# Altium footprint library PCBLIB.PcbLib: 557 footprints (part 14 of 36)
Each footprint in its own frame and in the unit in brackets; x right, y up, seen from the top. Pads: shape width x height; smd on the part's side, far side on the other; paste and mask are expansions set on the pad; w line width, h text height; cw(c..) or ccw(c..) is an arc to the next point about the centre after c.
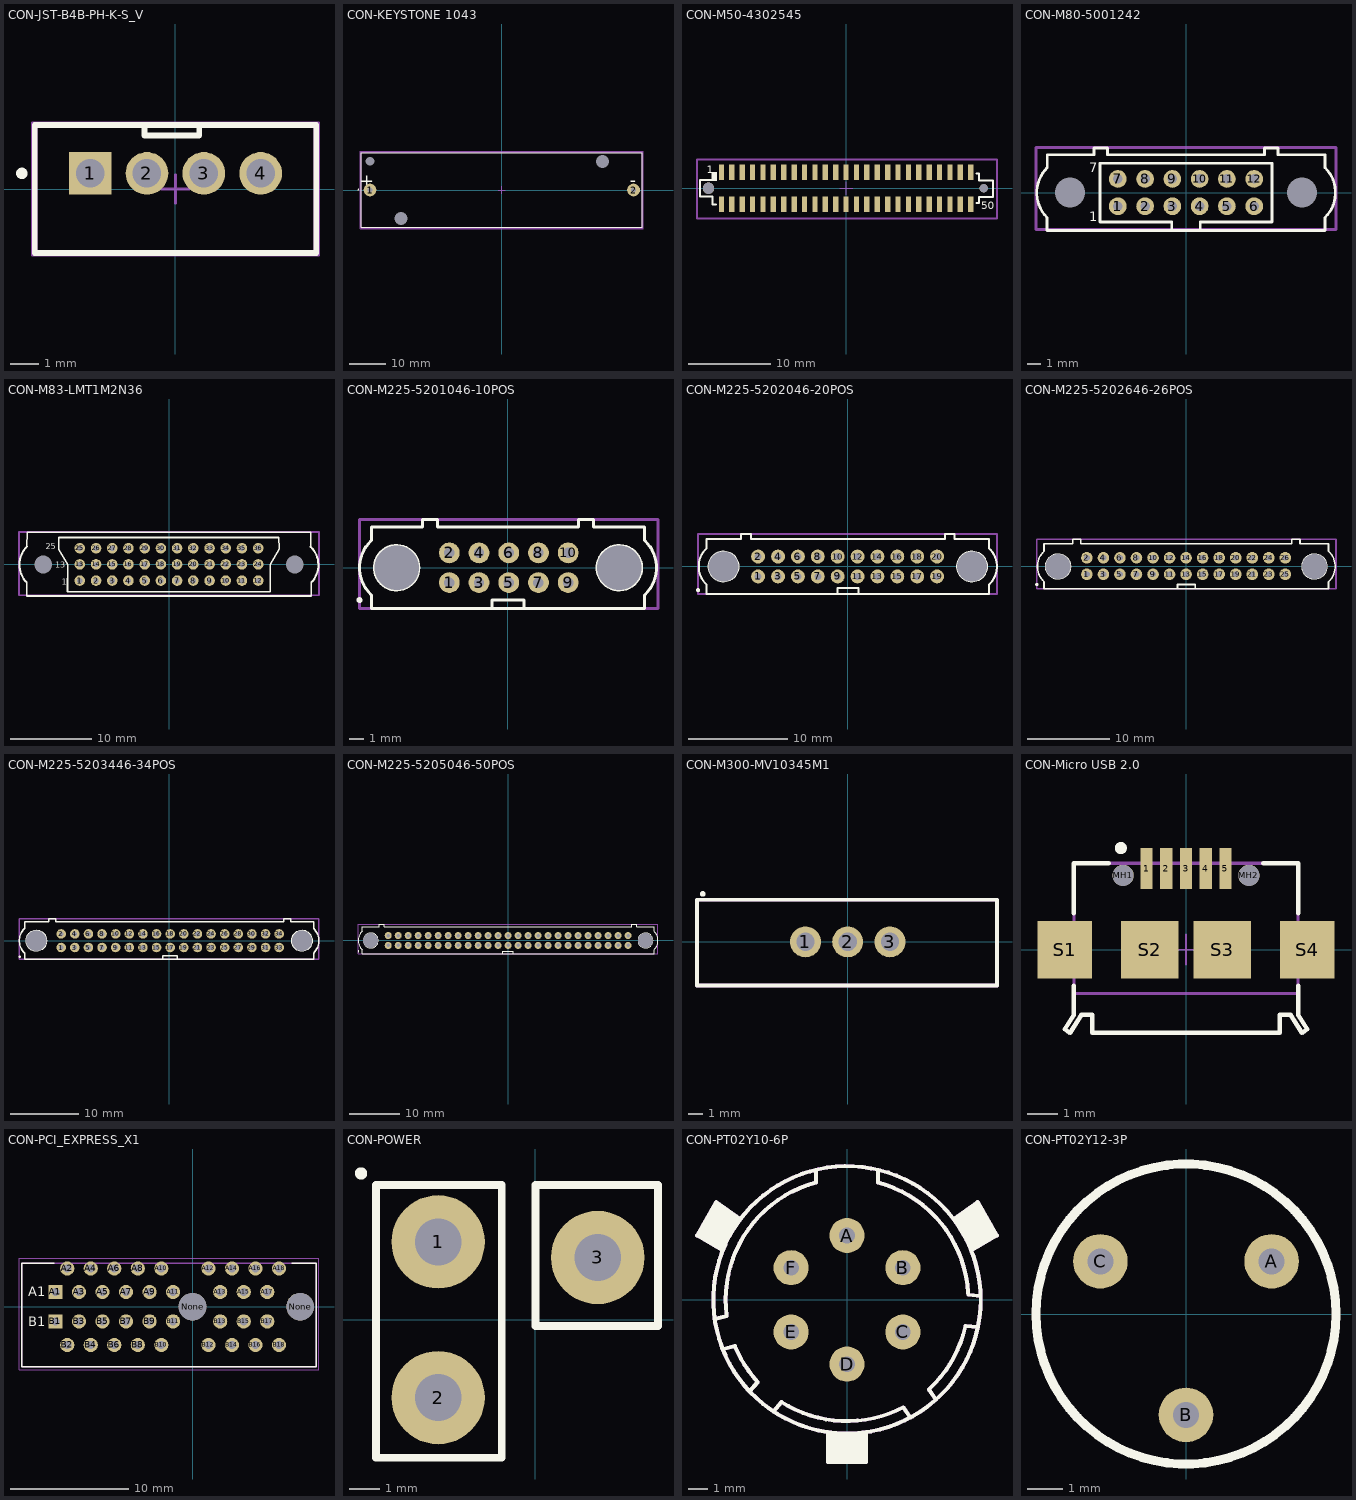
[diagram p13: the footprints below, top view; thin cyan lines are the x and y axes]

## CON-JST-B4B-PH-K-S_V [mm] "Connector, 4-Leads, Body 9.9x4.5mm, Pitch 2mm"
height 6
pads (4):
  rect 1.5x1.5 hole 1: 1(-3,0.55)
  round 1.5 hole 1: 2(-1,0.55) 3(1,0.55) 4(3,0.55)
Top Overlay:
  circle w0.2: c-5.4,0.55 r0.1
  lines w0.15: -1.088,1.882 -1.086,1.88 ; 0.83,1.88 0.837,1.887
  lines w0.2: -1.088,1.882 -1.088,2.25 ; -1.086,1.88 0.83,1.88 ; 0.837,1.887 0.837,2.25 ; -4.95,-2.25 -4.95,2.25 4.95,2.25 4.95,-2.25 -4.95,-2.25
Mechanical 15:
  lines w0.05: -5.05,-2.35 5.05,-2.35 5.05,2.35 -5.05,2.35 -5.05,-2.35
  lines w0.1: -0.5,0 0.5,0 ; 0,-0.5 0,0.5
ASM Top:
  lines w0.2: -4.95,-2.25 -4.95,2.25 4.95,2.25 4.95,-2.25 -4.95,-2.25
  text ".designator" at -0.676,-0.126 h0.8
3D body "B4B-PH-K-S.STEP": height 6.01, standoff -3.39, extent -4.95,-2.25 4.95,2.25

## CON-KEYSTONE 1043 [mm]
height 16
pads (5):
  round 3.5 hole 1.32 unplated: 1(-36.11,0) 2(36.11,0)
  rect 0x0 hole 2.39 unplated: M(-36.11,7.87)
  rect 0x0 hole 3.55 unplated: M(-27.6,-7.87) M(27.6,7.87)
Top Overlay:
  circle w0.2: c-39.3,0.1 r0.1
  lines w0.2: -38.5,-10.25 38.5,-10.25 38.5,10.25 -38.5,10.25 -38.5,-10.25
  text "-" at 36.8,4.85 h6
  text "+" at -35,5.15 h6
Mechanical 13:
  lines w0.1: -38.525,-10.325 38.525,-10.325 38.525,10.325 -38.525,10.325 -38.525,-10.325
Mechanical 15:
  lines w0.05: -38.8,-10.6 38.8,-10.6 38.8,10.6 -38.8,10.6 -38.8,-10.6
  lines w0.2: -1,0 1,0 ; 0,-1 0,1
ASM Top:
  lines w0.2: -38.5,-10.3 -38.5,10.3 38.5,10.3 38.5,-10.3 -38.5,-10.3
  text ".designator" at -1,0.2 h0.8
3D body "Keystone - PN1043.step": height 14.86, standoff -3.56, extent -38.527,-10.325 38.527,10.325

## CON-M50-4302545 [mm]
pads (52):
  rect 0.65x1.9 smd mask+0.05: 1(-15.24,1.95) 2(-13.97,1.95) 3(-12.7,1.95) 4(-11.43,1.95) 5(-10.16,1.95) 6(-8.89,1.95) 7(-7.62,1.95) 8(-6.35,1.95) 9(-5.08,1.95) 10(-3.81,1.95) 11(-2.54,1.95) 12(-1.27,1.95) 13(0,1.95) 14(1.27,1.95) 15(2.54,1.95) 16(3.81,1.95) 17(5.08,1.95) 18(6.35,1.95) 19(7.62,1.95) 20(8.89,1.95) 21(10.16,1.95) 22(11.43,1.95) 23(12.7,1.95) 24(13.97,1.95) 25(15.24,1.95) 26(-15.24,-1.95) 27(-13.97,-1.95) 28(-12.7,-1.95) 29(-11.43,-1.95) 30(-10.16,-1.95) 31(-8.89,-1.95) 32(-7.62,-1.95) 33(-6.35,-1.95) 34(-5.08,-1.95) 35(-3.81,-1.95) 36(-2.54,-1.95) 37(-1.27,-1.95) 38(0,-1.95) 39(1.27,-1.95) 40(2.54,-1.95) 41(3.81,-1.95) 42(5.08,-1.95) 43(6.35,-1.95) 44(7.62,-1.95) 45(8.89,-1.95) 46(10.16,-1.95) 47(11.43,-1.95) 48(12.7,-1.95) 49(13.97,-1.95) 50(15.24,-1.95)
  round 1.4 hole 1.4: MP1(-16.82,0)
  round 1 hole 1: MP2(16.82,0)
Top Overlay:
  rectangle: -16.325,0.875 -15.775,1.975
  lines w0.254: -15.9,-2 -16.325,-2 -16.325,-1.025 -17.875,-1.025 -17.85,1 -16.325,1 -16.325,1.85 -15.9,1.85 ; 15.925,-1.775 16.225,-1.775 16.225,-1.05 17.975,-1.05 17.975,0.975 16.225,0.975 16.225,1.825 15.925,1.825
  text "50" at 16.525,-2.875 h1.6
  text "1" at -17.05,1.55 h1.6
Mechanical 15:
  lines w0.15: -0.8,0 0,0 ; 0,-0.8 0,0 ; 0,0.8 0,0 ; 0.8,0 0,0
  lines w0.254: -18.225,-3.7 -18.225,3.525 18.45,3.525 18.45,-3.7 -18.225,-3.7
3D body "M50-4302545.stp": height 4.6, standoff -0.9, extent -17.725,-2.375 17.775,2.42

## CON-M80-5001242 [mm] "6+6 Pos. Male DIL Vertical Throughboard Conn. Jackscrews"
pads (16):
  round 1.3 hole 0.7: 1(-5,-1) 1(-5,-1) 2(-3,-1) 3(-1,-1) 4(1,-1) 5(3,-1) 6(5,-1) 7(-5,1) 7(-5,1) 8(-3,1) 9(-1,1) 10(1,1) 11(3,1) 12(5,1)
  round 0 hole 2.2 unplated: MP1(-8.5,0) MP2(8.5,0)
Top Overlay:
  lines w0.2: -10.2,-2.775 10.2,-2.775 10.2,-1.825 ccw(c8.375,0) 10.2,1.825 10.2,2.775 6.75,2.775 6.75,3.275 5.75,3.275 5.75,2.775 -5.75,2.775 -5.75,3.275 -6.75,3.275 -6.75,2.775 -10.175,2.775 -10.175,1.825 ccw(c-8.363,-0.012) -10.2,-1.825 -10.2,-2.775 ; -6.3,-2.15 -6.3,2.15 6.3,2.15 6.3,-2.15 1.05,-2.15 1.05,-2.775 1.025,-2.775 -1.05,-2.775 -1.05,-2.15 -6.3,-2.15
  text "7" at -7.1,1.5 h0.7
  text "1" at -7.1,-2.1 h0.7
ASM Top:
  lines w0.2: -11,-2.7 11,-2.7 11,3.3 -11,3.3 -11,-2.7
  text ".designator" at -0.5,0 h0.8
3D body "m80-5001205_asm.stp": height 5.61, standoff -3.24, extent -11,-2.775 11,3.275

## CON-M83-LMT1M2N36 [mm] "Connector Header Through Hole 36 position 0.079\" (2.00mm)"
pads (56):
  round 1.3 hole 0.65: 1(-11,-2) 1(-11,-2) 2(-9,-2) 3(-7,-2) 4(-5,-2) 5(-3,-2) 6(-1,-2) 7(1,-2) 8(3,-2) 9(5,-2) 10(7,-2) 11(9,-2) 12(11,-2) 13(-11,0) 13(-11,0) 14(-9,0) 15(-7,0) 16(-5,0) 17(-3,0) 18(-1,0.025) 19(1,0) 20(3,0) 21(5,0) 22(7,0) 23(9,0) 24(11,0) 25(-11,2) 25(-11,2) 26(-9,2) 27(-7,2) 28(-5,2) 29(-3,2) 30(-1,2) 31(1,2) 32(3,2) 33(5,2) 34(7,2) 35(9,2) 36(11,2)
  round 0 hole 2.2: 2(-15.5,0) 2(15.5,0)
  round 0 on Top Overlay: entry(-12.9,2.4) entry(-12.8,2.2) entry(-12.8,2.2) entry(-12.8,2.2) entry(-12.8,2.6) entry(-12.8,2.6) entry(-12.5,2.3)
  oval 0.1x0 on Top Overlay: entry(-12.8,2.2)
  round 0 on Drill Guide: entry(-12.8,2.6) entry(-12.8,2.6) entry(-12.8,2.6) entry(-12.5,2.1) entry(-12.4,2.3) entry(-12.4,2.3) entry(-12.1,1.8)
Top Overlay:
  lines w0.2: -17.55,-2.225 -17.55,-3.9 17.55,-3.9 ; -17.525,2.2 -17.5,3.95 17.5,3.95 17.475,2.175 ; 17.55,-3.875 17.55,-2.225 ; -13.575,1.85 -13.575,3.325 13.55,3.325 13.575,1.9 12.5,0 12.5,-3.35 -12.525,-3.35 -12.5,0 -13.575,1.85
  lines w0.254: -17.55,-2.225 cw(c-15.325,-0.025) -17.525,2.2 ; 17.475,2.175 cw(c15.312,-0.062) 17.55,-2.225
  text "25" at -15.2,1.9 h0.7
  text "13" at -14,-0.4 h0.7
  text "1" at -13.2,-2.5 h0.7
ASM Top:
  lines w0.2: -18.5,-3.8 -18.5,4 18.5,4 18.5,-3.8 -18.5,-3.8
  text ".designator" at 0.2,-0.1 h0.8
3D body "m83-lmt1m2n36-0000-000_asm.stp": height 6.11, standoff -4.49, extent -18.5,-3.85 18.5,3.85

## CON-M225-5201046-10POS [mm]
pads (12):
  round 1.4 hole 0.7: 1(-3.95,-1) 2(-3.95,1) 3(-1.95,-1) 4(-1.95,1) 5(0.05,-1) 6(0.05,1) 7(2.05,-1) 8(2.05,1) 9(4.05,-1) 10(4.05,1)
  round 0 hole 3 unplated: MH1(-7.5,0) MH2(7.5,0)
Top Overlay:
  circle w0.2: c-10,-2.175 r0.1
  circle w0.2: c7.5,0 r1.5
  circle w0.2: c-7.5,0 r1.5
  lines w0.2: -1.063,-2.75 -1.063,-2.175 1.062,-2.175 1.062,-2.75 ; -9.2,-2.75 9.2,-2.75 9.2,-1.833 ccw(c7.5,0) 9.2,1.833 9.2,2.75 5.75,2.75 5.75,3.25 4.75,3.25 4.75,2.75 -4.75,2.75 -4.75,3.25 -5.75,3.25 -5.75,2.75 -9.2,2.75 -9.2,1.833 ccw(c-7.5,0) -9.2,-1.833 -9.2,-2.75
ASM Top:
  lines w0.2: -10,-2.75 10.1,-2.75 10.1,3.25 -10,3.25 -10,-2.75
  text ".designator" at -2.21,-0.229 h0.8
3D body "m225-5201046_10pos.stp": height 5.45, standoff -3.4, extent -10,-2.75 10,3.25

## CON-M225-5202046-20POS [mm]
pads (22):
  round 1.4 hole 0.7: 1(-9.025,-1) 2(-9.025,1) 3(-7.025,-1) 4(-7.025,1) 5(-5.025,-1) 6(-5.025,1) 7(-3.025,-1) 8(-3.025,1) 9(-1.025,-1) 10(-1.025,1) 11(0.975,-1) 12(0.975,1) 13(2.975,-1) 14(2.975,1) 15(4.975,-1) 16(4.975,1) 17(6.975,-1) 18(6.975,1) 19(8.975,-1) 20(8.975,1)
  round 0 hole 3 unplated: MH1(-12.5,0) MH2(12.5,0)
Top Overlay:
  circle w0.2: c-12.5,0 r1.5
  circle w0.2: c12.497,0 r1.5
  circle w0.2: c-15.074,-2.381 r0.1
  lines w0.2: -9.838,3.25 -10.75,3.25 -10.75,2.75 -14.2,2.75 -14.2,1.833 ccw(c-12.5,0) -14.2,-1.833 -14.2,-2.75 14.197,-2.75 14.197,-1.833 ccw(c12.497,0) 14.197,1.833 14.197,2.75 10.75,2.75 10.75,3.25 9.75,3.25 9.75,2.75 -9.75,2.75 -9.75,3.25 ; -1.063,-2.75 -1.063,-2.175 1.062,-2.175 1.062,-2.75
ASM Top:
  lines w0.2: -15.074,-2.75 -15.074,-2.66 -15.074,3.25 15,3.25 15,-2.75 -15.074,-2.75
  text ".designator" at -2.159,-0.229 h0.8
3D body "m225-5202046_20POS.stp": height 5.45, standoff -3.4, extent -15,-2.75 15,3.25

## CON-M225-5202646-26POS [mm]
pads (28):
  round 1.4 hole 0.7: 1(-12.025,-0.95) 2(-12.025,1.05) 3(-10.025,-0.95) 4(-10.025,1.05) 5(-8.025,-0.95) 6(-8.025,1.05) 7(-6.025,-0.95) 8(-6.025,1.05) 9(-4.025,-0.95) 10(-4.025,1.05) 11(-2.025,-0.95) 12(-2.025,1.05) 13(-0.025,-0.95) 14(-0.025,1.05) 15(1.975,-0.95) 16(1.975,1.05) 17(3.975,-0.95) 18(3.975,1.05) 19(5.975,-0.95) 20(5.975,1.05) 21(7.975,-0.95) 22(7.975,1.05) 23(9.975,-0.95) 24(9.975,1.05) 25(11.975,-0.95) 26(11.975,1.05)
  round 0 hole 3: MH1(-15.5,0) MH2(15.5,0)
Top Overlay:
  circle w0.2: c-18.075,-2.175 r0.1
  circle w0.2: c-15.5,0 r1.5
  circle w0.2: c15.5,0 r1.5
  lines w0.2: -1.063,-2.7 -1.063,-2.175 1.062,-2.175 1.062,-2.7 ; -17.2,-2.7 17.2,-2.7 17.2,-1.833 ccw(c15.5,0) 17.2,1.833 17.2,2.75 13.75,2.75 13.75,3.3 12.75,3.3 12.75,2.75 -12.75,2.75 -12.75,3.3 -13.75,3.3 -13.75,2.75 -17.2,2.75 -17.2,1.833 ccw(c-15.5,0) -17.2,-1.833 -17.2,-2.7
ASM Top:
  lines w0.2: -18.075,-2.7 18.1,-2.7 18.1,3.3 -18.075,3.3 -18.075,-2.7
  text ".designator" at -1.448,-0.25 h0.8
3D body "m225-5202646_26POS.stp": height 5.45, standoff -3.4, extent -18,-2.75 18,3.25

## CON-M225-5203446-34POS [mm]
pads (36):
  round 1.4 hole 0.7: 1(-15.85,-1) 2(-15.85,1) 3(-13.85,-1) 4(-13.85,1) 5(-11.85,-1) 6(-11.85,1) 7(-9.85,-1) 8(-9.85,1) 9(-7.85,-1) 10(-7.85,1) 11(-5.85,-1) 12(-5.85,1) 13(-3.85,-1) 14(-3.85,1) 15(-1.85,-1) 16(-1.85,1) 17(0.15,-1) 18(0.15,1) 19(2.15,-1) 20(2.15,1) 21(4.15,-1) 22(4.15,1) 23(6.15,-1) 24(6.15,1) 25(8.15,-1) 26(8.15,1) 27(10.15,-1) 28(10.15,1) 29(12.15,-1) 30(12.15,1) 31(14.15,-1) 32(14.15,1) 33(16.15,-1) 34(16.15,1)
  round 0 hole 3 unplated: MH1(-19.5,0) MH2(19.5,0)
Top Overlay:
  circle w0.2: c-21.946,-2.362 r0.1
  circle w0.2: c19.5,0 r1.5
  circle w0.2: c-19.5,0 r1.5
  lines w0.2: -0.963,-2.75 -0.963,-2.175 1.162,-2.175 1.162,-2.75 ; -17.65,3.25 -16.65,3.25 -16.65,2.75 16.85,2.75 16.85,3.25 17.85,3.25 17.85,2.75 21.2,2.75 21.2,1.833 cw(c19.5,0) 21.2,-1.833 21.2,-2.75 -21.2,-2.75 -21.2,-1.833 cw(c-19.5,0) -21.2,1.833 -21.2,2.75 -17.65,2.75 -17.65,3.25 ; -17.65,3.25 -17.65,3.25
ASM Top:
  lines w0.2: -21.996,-2.75 -21.996,3.25 21.982,3.25 21.982,-2.75 -21.996,-2.75
  text ".designator" at -0.61,-0.203 h0.8
3D body "M225-5203446-34POS.stp": height 5.55, standoff -3.3, extent -21.9,-2.75 22.1,3.25

## CON-M225-5205046-50POS [mm]
pads (52):
  round 1.4 hole 0.7: 1(-24,-1) 2(-24,1) 3(-22,-1) 4(-22,1) 5(-20,-1) 6(-20,1) 7(-18,-1) 8(-18,1) 9(-16,-1) 10(-16,1) 11(-14,-1) 12(-14,1) 13(-12,-1) 14(-12,1) 15(-10,-1) 16(-10,1) 17(-8,-1) 18(-8,1) 19(-6,-1) 20(-6,1) 21(-4,-1) 22(-4,1) 23(-2,-1) 24(-2,1) 25(0,-1) 26(0,1) 27(2,-1) 28(2,1) 29(4,-1) 30(4,1) 31(6,-1) 32(6,1) 33(8,-1) 34(8,1) 35(10,-1) 36(10,1) 37(12,-1) 38(12,1) 39(14,-1) 40(14,1) 41(16,-1) 42(16,1) 43(18,-1) 44(18,1) 45(20,-1) 46(20,1) 47(22,-1) 48(22,1) 49(24,-1) 50(24,1)
  round 0 hole 3 unplated: MH1(27.5,0) MH2(-27.5,0)
Top Overlay:
  circle w0.2: c-29.947,-2.184 r0.1
  circle w0.2: c-27.5,0 r1.5
  circle w0.2: c27.5,0 r1.5
  lines w0.2: -1.063,-2.7 -1.063,-2.125 1.062,-2.125 1.062,-2.7 ; 29.194,2.8 25.75,2.8 25.75,3.3 24.75,3.3 24.75,2.8 -24.75,2.8 -24.75,3.3 -25.75,3.3 -25.75,2.8 -29.2,2.8 -29.2,1.833 ccw(c-27.5,0) -29.2,-1.833 -29.2,-2.7 29.2,-2.7 29.2,-1.833 ccw(c27.5,0) 29.2,1.833 29.2,2.8
ASM Top:
  lines w0.2: -30,-2.7 -30,3.3 30,3.3 30,-2.7 -30,-2.7
  text ".designator" at -0.61,-0.127 h0.8
3D body "M225-5205046.stp": height 5.45, standoff -3.4, extent -30,-2.7 30,3.3

## CON-M300-MV10345M1 [mm]
pads (3):
  round 2.2 hole 1.3: 1(-3,0) 2(0,0) 3(3,0)
Top Overlay:
  circle w0.2: c-10.287,3.404 r0.1
  lines w0.254: -10.7,-3.1 10.6,-3.1 10.6,3 -10.7,3 -10.7,-3.1
ASM Top:
  lines w0.254: -10.7,-3.1 -10.7,3 10.6,3 10.6,-3.1 -10.7,-3.1
  text ".designator" at -7.1,-0.5 h0.8
3D body "m300-mv10345m1_asm.stp": height 7, standoff -3.2, extent -10.7,-3 10.6,3

## CON-Micro USB 2.0 [mm] "Micro USB 2.0 SMT Type B Horizontal 5 Contacts"
height 3
pads (11):
  rect 0.4x1.35 smd: 1(-1.3,2.675) 2(-0.65,2.675) 3(0,2.675) 4(0.65,2.675) 5(1.3,2.675)
  round 0.7 hole 0.7 unplated: MH1(-2.075,2.45) MH2(2.075,2.45)
  rect 1.8x1.9 smd: S1(-4,0) S4(4,0)
  rect 1.9x1.9 smd: S2(-1.2,0) S3(1.2,0)
Top Overlay:
  circle w0.2: c-2.15,3.35 r0.1
  lines w0.15: -3.7,-1.2 -3.7,-2.15 -4,-2.625 -3.825,-2.75 -3.45,-2.15 -3.1,-2.15 -3.1,-2.75 3.1,-2.75 3.1,-2.15 3.45,-2.15 3.825,-2.75 4,-2.625 3.7,-2.15 3.7,-1.2 ; -3.7,1.2 -3.7,2.85 -2.55,2.85 ; 2.55,2.85 3.7,2.85 3.7,1.2
Dimensions:
  lines w0.1: -3.7,-1.45 3.7,-1.45
  text "PCB Edge" at -1.2,-2.1 h0.41
Mechanical 15:
  lines w0.05: -0.5,0 0.5,0 ; 0,-0.5 0,0.5
ASM Top:
  lines w0.1: -1.425,2.85 -1.425,3.15 -1.175,3.15 -1.175,2.85 ; -0.775,2.85 -0.775,3.15 -0.525,3.15 -0.525,2.85 ; -0.125,2.85 -0.125,3.15 0.125,3.15 0.125,2.85 ; 0.525,2.85 0.525,3.15 0.775,3.15 0.775,2.85 ; 1.175,2.85 1.175,3.15 1.425,3.15 1.425,2.85 ; -4,-2.625 -3.825,-2.75 -3.45,-2.15 -3.1,-2.15 -3.1,-2.75 3.1,-2.75 3.1,-2.15 3.45,-2.15 3.825,-2.75 4,-2.625 3.7,-2.15 3.7,2.85 -3.7,2.85 -3.7,-2.15 -4,-2.625
  text ".designator" at -0.65,0 h0.8
3D body "629105136821.stp": height 2.69, standoff -0.61, extent -4,-2.73 4,3.173

## CON-PCI_EXPRESS_X1 [mm]
pads (38):
  rect 1.208x1.208 hole 0.7: A1(-11.65,1.25) B1(-11.65,-1.25)
  round 1.208 hole 0.7: A2(-10.65,3.25) A3(-9.65,1.25) A4(-8.65,3.25) A5(-7.65,1.25) A6(-6.65,3.25) A7(-5.65,1.25) A8(-4.65,3.25) A9(-3.65,1.25) A10(-2.65,3.25) A11(-1.65,1.25) A12(1.35,3.25) A13(2.35,1.25) A14(3.35,3.25) A15(4.35,1.25) A16(5.35,3.25) A17(6.35,1.25) A18(7.35,3.25) B2(-10.65,-3.25) B3(-9.65,-1.25) B4(-8.65,-3.25) B5(-7.65,-1.25) B6(-6.65,-3.25) B7(-5.65,-1.25) B8(-4.65,-3.25) B9(-3.65,-1.25) B10(-2.65,-3.25) B11(-1.65,-1.25) B12(1.35,-3.25) B13(2.35,-1.25) B14(3.35,-3.25) B15(4.35,-1.25) B16(5.35,-3.25) B17(6.35,-1.25) B18(7.35,-3.25)
  round 2.35 hole 2.35 unplated: None(0,0) None(9.15,0)
Top Overlay:
  lines w0.127: -11.75,3.7 -14.5,3.7 -14.5,-5.1 10.5,-5.1 10.5,3.7 8.45,3.7
  text "A1" at -13.97,0.889 h0.81
  text "B1" at -13.97,-1.651 h0.81
Bottom 3D Body:
  lines w0.127: -14.5,-5.1 10.5,-5.1 ; -14.5,-5.1 -14.5,3.7 ; -14.5,-5.1 10.5,-5.1 ; -14.5,-5.1 -14.5,3.7 ; -14.5,3.7 10.5,3.7 ; -14.5,3.7 10.5,3.7 ; 10.5,-5.1 10.5,3.7 ; 10.5,-5.1 10.5,3.7
Mechanical 16:
  lines w0.05: -14.75,-5.35 10.75,-5.35 10.75,4.11 -14.75,4.11 -14.75,-5.35
3D body "10018784-10210TLF.step": height 11, standoff -4.4, extent -14.627,-5.1 10.373,3.7

## CON-POWER [mil]
pads (3):
  round 120 hole 60: 1(-125,100) 2(-125,-100) 3(80,80)
Top Overlay:
  circle w7.87: c-224,188 r3.94
  lines w10: -204.72,-177.17 -43.31,-177.17 -43.31,173.23 -204.72,173.23 -204.72,-177.17 ; 0,-7.87 157.48,-7.87 157.48,173.23 0,173.23 0,-7.87

## CON-PT02Y10-6P [mm]
pads (6):
  round 1.8 hole 0.8: A(0,3.3) B(2.87,1.65) C(2.87,-1.65) D(0,-3.3) E(-2.87,-1.65) F(-2.87,1.65)
Top Overlay:
  circle w0.2: c0,0 r6.86
  region: -0.99,-6.788 -0.99,-8.315 0.99,-8.315 0.99,-6.789
  region: 6.706,5.015 5.471,4.137 6.373,2.538 7.696,3.301
  region: -6.706,5.015 -7.696,3.301 -6.374,2.535 -5.471,4.137
  lines w0.2: -6.788,-0.991 -6.17,-0.826 ; -6.374,-2.537 -5.756,-2.371 ccw(c0,0) -4.581,-4.215 -4.992,-4.705 ; -6.374,2.535 -7.696,3.301 -6.706,5.015 -5.471,4.137 ; -6.168,-0.838 cw(c0,0) -1.6,6.015 ; -3.767,-5.734 -3.355,-5.244 ccw(c0,0) 2.885,-5.516 3.252,-6.04 ; -1.6,6.015 -1.6,6.67 ; -0.99,-6.788 -0.99,-8.315 0.99,-8.315 0.99,-6.789 ; 1.6,6.015 cw(c0,0) 6.215,0.347 ; 1.6,6.015 1.6,6.67 ; 4.563,-5.123 4.196,-4.599 ccw(c0,0) 6.067,-1.391 ; 5.471,4.137 6.706,5.015 7.696,3.301 6.373,2.538 ; 6.08,-1.336 6.717,-1.391 ; 6.219,0.258 6.857,0.203
ASM Top:
  circle w0.2: c0,0 r6.86
  region: -6.706,5.016 -7.696,3.301 -6.374,2.536 -5.471,4.138
  region: 6.706,5.016 5.471,4.138 6.373,2.538 7.696,3.301
  region: -0.99,-6.788 -0.99,-8.314 0.99,-8.314 0.99,-6.788
  lines w0.2: -6.788,-0.991 -6.17,-0.825 ; -6.374,-2.536 -5.756,-2.371 ccw(c0,0) -4.581,-4.215 -4.992,-4.705 ; -6.374,2.536 -7.696,3.301 -6.706,5.016 -5.471,4.138 ; -6.168,-0.838 cw(c0,0) -1.6,6.016 -1.6,6.671 ; -3.767,-5.733 -3.355,-5.243 ccw(c0,0) 2.886,-5.516 3.253,-6.04 ; -0.99,-6.788 -0.99,-8.314 0.99,-8.314 0.99,-6.788 ; 1.6,6.671 1.6,6.016 cw(c0,0) 6.215,0.348 ; 4.563,-5.122 4.196,-4.598 ccw(c0,0) 6.068,-1.391 ; 5.471,4.138 6.706,5.016 7.696,3.301 6.373,2.538 ; 6.08,-1.335 6.717,-1.391 ; 6.22,0.259 6.857,0.203
  text ".designator" at -0.914,-0.178 h0.8
3D body "45102E - PT02A size 10.STEP": height 23, standoff -2.06, extent -11.9,-11.9 11.9,11.908

## CON-PT02Y12-3P [mm]
pads (3):
  round 1.524 hole 0.72: A(2.39,1.47) B(0,-2.82) C(-2.39,1.47)
Top Overlay:
  circle w0.254: c0,0 r4.191
ASM Top:
  circle w0.2: c0,0 r4.191
  text ".designator" at -0.203,-0.025 h0.8